# Altium footprint library BBC_Connectors.PcbLib: 141 footprints (part 3 of 9)
Each footprint in its own frame and in the unit in brackets; x right, y up, seen from the top. Pads: shape width x height; smd on the part's side, far side on the other; paste and mask are expansions set on the pad; w line width, h text height; cw(c..) or ccw(c..) is an arc to the next point about the centre after c.
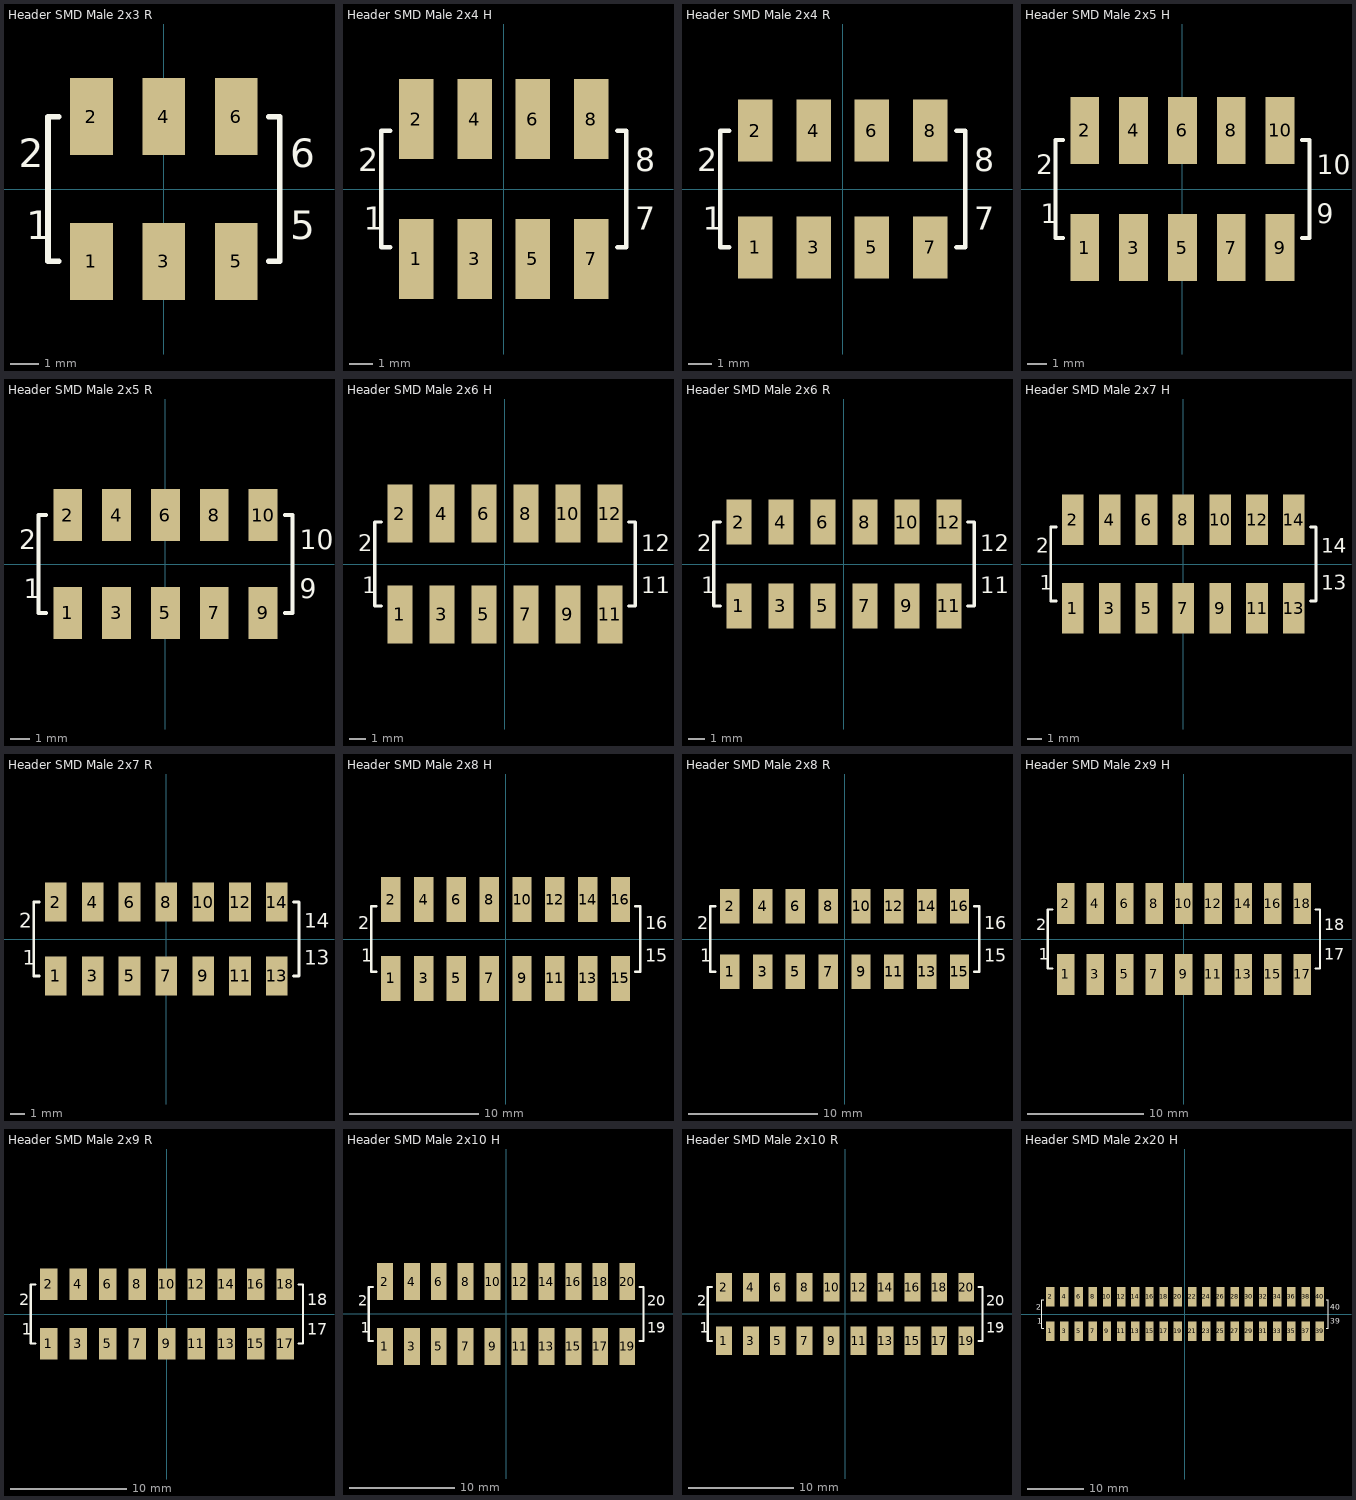
[diagram p2: the footprints below, top view; thin cyan lines are the x and y axes]

## Header SMD Male 2x3 R [mm] "male header for smd mounting / pitch = 2.54mm / reflow soldering"
height 11
pads (6):
  rect 1.5x2.7 smd: 1(-2.54,-2.54) 2(-2.54,2.54) 3(0,-2.54) 4(0,2.54) 5(2.54,-2.54) 6(2.54,2.54)
Top Overlay:
  lines w0.2: -3.683,-2.54 -4.064,-2.54 -4.064,2.54 -3.683,2.54 ; 3.683,-2.54 4.064,-2.54 4.064,2.54 3.683,2.54
  text "5" at 4.445,-1.77 h1
  text "6" at 4.445,0.77 h1
  text "2" at -5.08,0.77 h1
  text "1" at -4.826,-1.77 h1
3D body "Header SMD Male 2x3.step": height 8.78, standoff -0.04, extent -3.81,-3.694 3.81,3.694

## Header SMD Male 2x4 H [mm] "male header for smd mounting / pitch = 2.54mm / hand soldering"
height 11
pads (8):
  rect 1.5x3.5 smd: 1(-3.81,-3.048) 2(-3.81,3.048) 3(-1.27,-3.048) 4(-1.27,3.048) 5(1.27,-3.048) 6(1.27,3.048) 7(3.81,-3.048) 8(3.81,3.048)
Top Overlay:
  lines w0.2: -4.953,-2.54 -5.334,-2.54 -5.334,2.54 -4.953,2.54 ; 4.953,-2.54 5.334,-2.54 5.334,2.54 4.953,2.54
  text "1" at -6.096,-1.77 h1
  text "2" at -6.35,0.77 h1
  text "8" at 5.715,0.77 h1
  text "7" at 5.715,-1.77 h1
3D body "Header SMD Male 2x4.step": height 8.78, standoff -0.04, extent -5.08,-3.694 5.08,3.694

## Header SMD Male 2x4 R [mm] "male header for smd mounting / pitch = 2.54mm / reflow soldering"
height 11
pads (8):
  rect 1.5x2.7 smd: 1(-3.81,-2.54) 2(-3.81,2.54) 3(-1.27,-2.54) 4(-1.27,2.54) 5(1.27,-2.54) 6(1.27,2.54) 7(3.81,-2.54) 8(3.81,2.54)
Top Overlay:
  lines w0.2: -4.953,-2.54 -5.334,-2.54 -5.334,2.54 -4.953,2.54 ; 4.953,-2.54 5.334,-2.54 5.334,2.54 4.953,2.54
  text "7" at 5.715,-1.77 h1
  text "8" at 5.715,0.77 h1
  text "2" at -6.35,0.77 h1
  text "1" at -6.096,-1.77 h1
3D body "Header SMD Male 2x4.step": height 8.78, standoff -0.04, extent -5.08,-3.694 5.08,3.694

## Header SMD Male 2x5 H [mm] "male header for smd mounting / pitch = 2.54mm / hand soldering / hand soldering"
height 11
pads (10):
  rect 1.5x3.5 smd: 1(-5.08,-3.048) 2(-5.08,3.048) 3(-2.54,-3.048) 4(-2.54,3.048) 5(0,-3.048) 6(0,3.048) 7(2.54,-3.048) 8(2.54,3.048) 9(5.08,-3.048) 10(5.08,3.048)
Top Overlay:
  lines w0.2: -6.223,-2.54 -6.604,-2.54 -6.604,2.54 -6.223,2.54 ; 6.223,-2.54 6.604,-2.54 6.604,2.54 6.223,2.54
  text "9" at 6.985,-1.77 h1
  text "10" at 6.985,0.77 h1
  text "2" at -7.62,0.77 h1
  text "1" at -7.366,-1.77 h1
3D body "Header SMD Male 2x5.step": height 8.78, standoff -0.04, extent -6.35,-3.694 6.35,3.694

## Header SMD Male 2x5 R [mm] "male header for smd mounting / pitch = 2.54mm / hand soldering / reflow soldering"
height 11
pads (10):
  rect 1.5x2.7 smd: 1(-5.08,-2.54) 2(-5.08,2.54) 3(-2.54,-2.54) 4(-2.54,2.54) 5(0,-2.54) 6(0,2.54) 7(2.54,-2.54) 8(2.54,2.54) 9(5.08,-2.54) 10(5.08,2.54)
Top Overlay:
  lines w0.2: -6.223,-2.54 -6.604,-2.54 -6.604,2.54 -6.223,2.54 ; 6.223,-2.54 6.604,-2.54 6.604,2.54 6.223,2.54
  text "1" at -7.366,-1.77 h1
  text "2" at -7.62,0.77 h1
  text "10" at 6.985,0.77 h1
  text "9" at 6.985,-1.77 h1
3D body "Header SMD Male 2x5.step": height 8.78, standoff -0.04, extent -6.35,-3.694 6.35,3.694

## Header SMD Male 2x6 H [mm] "male header for smd mounting / pitch = 2.54mm / hand soldering"
height 11
pads (12):
  rect 1.5x3.5 smd: 1(-6.35,-3.048) 2(-6.35,3.048) 3(-3.81,-3.048) 4(-3.81,3.048) 5(-1.27,-3.048) 6(-1.27,3.048) 7(1.27,-3.048) 8(1.27,3.048) 9(3.81,-3.048) 10(3.81,3.048) 11(6.35,-3.048) 12(6.35,3.048)
Top Overlay:
  lines w0.2: -7.493,-2.54 -7.874,-2.54 -7.874,2.54 -7.493,2.54 ; 7.493,-2.54 7.874,-2.54 7.874,2.54 7.493,2.54
  text "1" at -8.636,-1.77 h1
  text "2" at -8.89,0.77 h1
  text "12" at 8.255,0.77 h1
  text "11" at 8.255,-1.77 h1
3D body "Header SMD Male 2x6.step": height 8.78, standoff -0.04, extent -7.62,-3.694 7.62,3.694

## Header SMD Male 2x6 R [mm] "male header for smd mounting / pitch = 2.54mm / reflow soldering"
height 11
pads (12):
  rect 1.5x2.7 smd: 1(-6.35,-2.54) 2(-6.35,2.54) 3(-3.81,-2.54) 4(-3.81,2.54) 5(-1.27,-2.54) 6(-1.27,2.54) 7(1.27,-2.54) 8(1.27,2.54) 9(3.81,-2.54) 10(3.81,2.54) 11(6.35,-2.54) 12(6.35,2.54)
Top Overlay:
  lines w0.2: -7.493,-2.54 -7.874,-2.54 -7.874,2.54 -7.493,2.54 ; 7.493,-2.54 7.874,-2.54 7.874,2.54 7.493,2.54
  text "11" at 8.255,-1.77 h1
  text "12" at 8.255,0.77 h1
  text "2" at -8.89,0.77 h1
  text "1" at -8.636,-1.77 h1
3D body "Header SMD Male 2x6.step": height 8.78, standoff -0.04, extent -7.62,-3.694 7.62,3.694

## Header SMD Male 2x7 H [mm] "male header for smd mounting / pitch = 2.54mm / hand soldering"
height 11
pads (14):
  rect 1.5x3.5 smd: 1(-7.62,-3.048) 2(-7.62,3.048) 3(-5.08,-3.048) 4(-5.08,3.048) 5(-2.54,-3.048) 6(-2.54,3.048) 7(0,-3.048) 8(0,3.048) 9(2.54,-3.048) 10(2.54,3.048) 11(5.08,-3.048) 12(5.08,3.048) 13(7.62,-3.048) 14(7.62,3.048)
Top Overlay:
  lines w0.2: -8.763,-2.54 -9.144,-2.54 -9.144,2.54 -8.763,2.54 ; 8.763,-2.54 9.144,-2.54 9.144,2.54 8.763,2.54
  text "1" at -9.906,-1.77 h1
  text "2" at -10.16,0.77 h1
  text "14" at 9.525,0.77 h1
  text "13" at 9.525,-1.77 h1
3D body "Header SMD Male 2x7.step": height 8.78, standoff -0.04, extent -8.89,-3.694 8.89,3.694

## Header SMD Male 2x7 R [mm] "male header for smd mounting / pitch = 2.54mm / reflow soldering"
height 11
pads (14):
  rect 1.5x2.7 smd: 1(-7.62,-2.54) 2(-7.62,2.54) 3(-5.08,-2.54) 4(-5.08,2.54) 5(-2.54,-2.54) 6(-2.54,2.54) 7(0,-2.54) 8(0,2.54) 9(2.54,-2.54) 10(2.54,2.54) 11(5.08,-2.54) 12(5.08,2.54) 13(7.62,-2.54) 14(7.62,2.54)
Top Overlay:
  lines w0.2: -8.763,-2.54 -9.144,-2.54 -9.144,2.54 -8.763,2.54 ; 8.763,-2.54 9.144,-2.54 9.144,2.54 8.763,2.54
  text "13" at 9.525,-1.77 h1
  text "14" at 9.525,0.77 h1
  text "2" at -10.16,0.77 h1
  text "1" at -9.906,-1.77 h1
3D body "Header SMD Male 2x7.step": height 8.78, standoff -0.04, extent -8.89,-3.694 8.89,3.694

## Header SMD Male 2x8 H [mm] "male header for smd mounting / pitch = 2.54mm / hand soldering"
height 11
pads (16):
  rect 1.5x3.5 smd: 1(-8.89,-3.048) 2(-8.89,3.048) 3(-6.35,-3.048) 4(-6.35,3.048) 5(-3.81,-3.048) 6(-3.81,3.048) 7(-1.27,-3.048) 8(-1.27,3.048) 9(1.27,-3.048) 10(1.27,3.048) 11(3.81,-3.048) 12(3.81,3.048) 13(6.35,-3.048) 14(6.35,3.048) 15(8.89,-3.048) 16(8.89,3.048)
Top Overlay:
  lines w0.2: -10.033,-2.54 -10.414,-2.54 -10.414,2.54 -10.033,2.54 ; 10.033,-2.54 10.414,-2.54 10.414,2.54 10.033,2.54
  text "1" at -11.176,-1.77 h1
  text "2" at -11.43,0.77 h1
  text "16" at 10.795,0.77 h1
  text "15" at 10.795,-1.77 h1
3D body "Header SMD Male 2x8.step": height 8.78, standoff -0.04, extent -10.16,-3.694 10.16,3.694

## Header SMD Male 2x8 R [mm] "male header for smd mounting / pitch = 2.54mm / reflow soldering"
height 11
pads (16):
  rect 1.5x2.7 smd: 1(-8.89,-2.54) 2(-8.89,2.54) 3(-6.35,-2.54) 4(-6.35,2.54) 5(-3.81,-2.54) 6(-3.81,2.54) 7(-1.27,-2.54) 8(-1.27,2.54) 9(1.27,-2.54) 10(1.27,2.54) 11(3.81,-2.54) 12(3.81,2.54) 13(6.35,-2.54) 14(6.35,2.54) 15(8.89,-2.54) 16(8.89,2.54)
Top Overlay:
  lines w0.2: -10.033,-2.54 -10.414,-2.54 -10.414,2.54 -10.033,2.54 ; 10.033,-2.54 10.414,-2.54 10.414,2.54 10.033,2.54
  text "15" at 10.795,-1.77 h1
  text "16" at 10.795,0.77 h1
  text "2" at -11.43,0.77 h1
  text "1" at -11.176,-1.77 h1
3D body "Header SMD Male 2x8.step": height 8.78, standoff -0.04, extent -10.16,-3.694 10.16,3.694

## Header SMD Male 2x9 H [mm] "male header for smd mounting / pitch = 2.54mm / hand soldering"
height 11
pads (18):
  rect 1.5x3.5 smd: 1(-10.16,-3.048) 2(-10.16,3.048) 3(-7.62,-3.048) 4(-7.62,3.048) 5(-5.08,-3.048) 6(-5.08,3.048) 7(-2.54,-3.048) 8(-2.54,3.048) 9(0,-3.048) 10(0,3.048) 11(2.54,-3.048) 12(2.54,3.048) 13(5.08,-3.048) 14(5.08,3.048) 15(7.62,-3.048) 16(7.62,3.048) 17(10.16,-3.048) 18(10.16,3.048)
Top Overlay:
  lines w0.2: -11.303,-2.54 -11.684,-2.54 -11.684,2.54 -11.303,2.54 ; 11.303,-2.54 11.684,-2.54 11.684,2.54 11.303,2.54
  text "1" at -12.446,-1.77 h1
  text "2" at -12.7,0.77 h1
  text "18" at 12.065,0.77 h1
  text "17" at 12.065,-1.77 h1
3D body "Header SMD Male 2x9.step": height 8.78, standoff -0.04, extent -11.43,-3.694 11.43,3.694

## Header SMD Male 2x9 R [mm] "male header for smd mounting / pitch = 2.54mm / reflow soldering"
height 11
pads (18):
  rect 1.5x2.7 smd: 1(-10.16,-2.54) 2(-10.16,2.54) 3(-7.62,-2.54) 4(-7.62,2.54) 5(-5.08,-2.54) 6(-5.08,2.54) 7(-2.54,-2.54) 8(-2.54,2.54) 9(0,-2.54) 10(0,2.54) 11(2.54,-2.54) 12(2.54,2.54) 13(5.08,-2.54) 14(5.08,2.54) 15(7.62,-2.54) 16(7.62,2.54) 17(10.16,-2.54) 18(10.16,2.54)
Top Overlay:
  lines w0.2: -11.303,-2.54 -11.684,-2.54 -11.684,2.54 -11.303,2.54 ; 11.303,-2.54 11.684,-2.54 11.684,2.54 11.303,2.54
  text "17" at 12.065,-1.77 h1
  text "18" at 12.065,0.77 h1
  text "2" at -12.7,0.77 h1
  text "1" at -12.446,-1.77 h1
3D body "Header SMD Male 2x9.step": height 8.78, standoff -0.04, extent -11.43,-3.694 11.43,3.694

## Header SMD Male 2x10 H [mm] "male header for smd mounting / pitch = 2.54mm / hand soldering"
height 11
pads (20):
  rect 1.5x3.5 smd: 1(-11.43,-3.048) 2(-11.43,3.048) 3(-8.89,-3.048) 4(-8.89,3.048) 5(-6.35,-3.048) 6(-6.35,3.048) 7(-3.81,-3.048) 8(-3.81,3.048) 9(-1.27,-3.048) 10(-1.27,3.048) 11(1.27,-3.048) 12(1.27,3.048) 13(3.81,-3.048) 14(3.81,3.048) 15(6.35,-3.048) 16(6.35,3.048) 17(8.89,-3.048) 18(8.89,3.048) 19(11.43,-3.048) 20(11.43,3.048)
Top Overlay:
  lines w0.2: -12.573,-2.54 -12.954,-2.54 -12.954,2.54 -12.573,2.54 ; 12.573,-2.54 12.954,-2.54 12.954,2.54 12.573,2.54
  text "1" at -13.716,-1.77 h1
  text "2" at -13.97,0.77 h1
  text "20" at 13.335,0.77 h1
  text "19" at 13.335,-1.77 h1
3D body "Header SMD Male 2x10.step": height 8.78, standoff -0.04, extent -12.7,-3.694 12.7,3.694

## Header SMD Male 2x10 R [mm] "male header for smd mounting / pitch = 2.54mm / reflow soldering"
height 11
pads (20):
  rect 1.5x2.7 smd: 1(-11.43,-2.54) 2(-11.43,2.54) 3(-8.89,-2.54) 4(-8.89,2.54) 5(-6.35,-2.54) 6(-6.35,2.54) 7(-3.81,-2.54) 8(-3.81,2.54) 9(-1.27,-2.54) 10(-1.27,2.54) 11(1.27,-2.54) 12(1.27,2.54) 13(3.81,-2.54) 14(3.81,2.54) 15(6.35,-2.54) 16(6.35,2.54) 17(8.89,-2.54) 18(8.89,2.54) 19(11.43,-2.54) 20(11.43,2.54)
Top Overlay:
  lines w0.2: -12.573,-2.54 -12.954,-2.54 -12.954,2.54 -12.573,2.54 ; 12.573,-2.54 12.954,-2.54 12.954,2.54 12.573,2.54
  text "19" at 13.335,-1.77 h1
  text "20" at 13.335,0.77 h1
  text "2" at -13.97,0.77 h1
  text "1" at -13.716,-1.77 h1
3D body "Header SMD Male 2x10.step": height 8.78, standoff -0.04, extent -12.7,-3.694 12.7,3.694

## Header SMD Male 2x20 H [mm] "male header for smd mounting / pitch = 2.54mm / hand soldering"
height 11
pads (40):
  rect 1.5x3.5 smd: 1(-24.13,-3.048) 2(-24.13,3.048) 3(-21.59,-3.048) 4(-21.59,3.048) 5(-19.05,-3.048) 6(-19.05,3.048) 7(-16.51,-3.048) 8(-16.51,3.048) 9(-13.97,-3.048) 10(-13.97,3.048) 11(-11.43,-3.048) 12(-11.43,3.048) 13(-8.89,-3.048) 14(-8.89,3.048) 15(-6.35,-3.048) 16(-6.35,3.048) 17(-3.81,-3.048) 18(-3.81,3.048) 19(-1.27,-3.048) 20(-1.27,3.048) 21(1.27,-3.048) 22(1.27,3.048) 23(3.81,-3.048) 24(3.81,3.048) 25(6.35,-3.048) 26(6.35,3.048) 27(8.89,-3.048) 28(8.89,3.048) 29(11.43,-3.048) 30(11.43,3.048) 31(13.97,-3.048) 32(13.97,3.048) 33(16.51,-3.048) 34(16.51,3.048) 35(19.05,-3.048) 36(19.05,3.048) 37(21.59,-3.048) 38(21.59,3.048) 39(24.13,-3.048) 40(24.13,3.048)
Top Overlay:
  lines w0.2: -25.273,-2.54 -25.654,-2.54 -25.654,2.54 -25.273,2.54 ; 25.273,-2.54 25.654,-2.54 25.654,2.54 25.273,2.54
  text "1" at -26.416,-1.77 h1
  text "2" at -26.67,0.77 h1
  text "40" at 26.035,0.77 h1
  text "39" at 26.035,-1.77 h1
3D body "Header SMD Male 2x20.step": height 8.78, standoff -0.04, extent -25.4,-3.694 25.4,3.694